# Altium footprint library CeleronLib_THD.PcbLib: 217 footprints (part 8 of 14)
Each footprint in its own frame and in the unit in brackets; x right, y up, seen from the top. Pads: shape width x height; smd on the part's side, far side on the other; paste and mask are expansions set on the pad; w line width, h text height; cw(c..) or ccw(c..) is an arc to the next point about the centre after c.
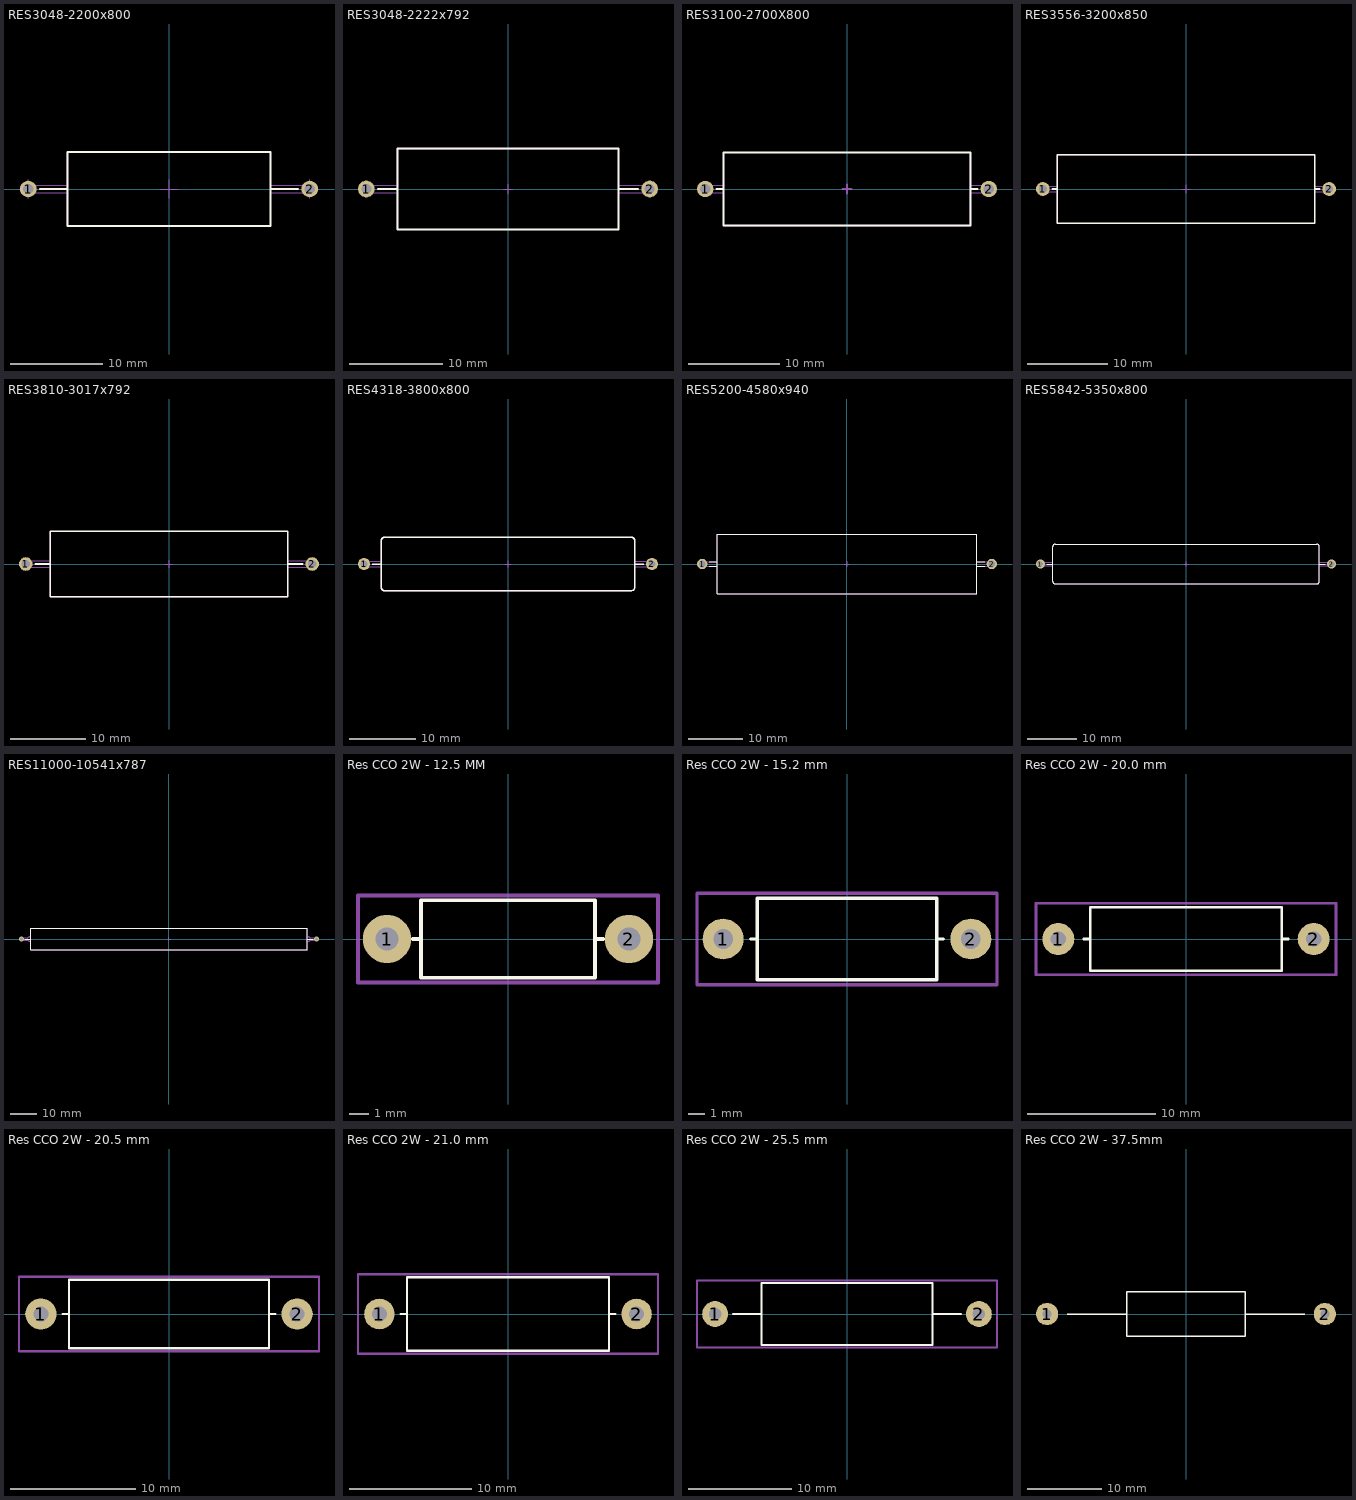
[diagram p7: the footprints below, top view; thin cyan lines are the x and y axes]

## RES3048-2200x800 [mm] "Resistor, Axial, Leads spacing 30.48mm, Lead Dia. 0.8, Body Lengh 22mm, Diameter 8mm"
height 8
pads (2):
  round 1.8 hole 1.1: 1(-15.24,0) 2(15.24,0)
Top Overlay:
  lines w0.2: -14,0 -11,0 ; 11,0 14,0 ; -11,-4 11,-4 11,4 -11,4 -11,-4
Mechanical 8:
  lines w0.1: -16.24,0 -15.24,0 ; -15.24,-1 -15.24,0 ; -15.24,1 -15.24,0 ; -14.24,0 -15.24,0 ; -1,0 0,0 ; 0,-1 0,0 ; 0,1 0,0 ; 1,0 0,0 ; 14.24,0 15.24,0 ; 15.24,-1 15.24,0 ; 15.24,1 15.24,0 ; 16.24,0 15.24,0
Top Assy:
  lines w0.1: -11,-0.4 -15.24,-0.4 cw(c-15.24,0) -15.24,0.4 -11,0.4 ; 11,-0.4 15.24,-0.4 ccw(c15.24,0) 15.24,0.4 11,0.4 ; -11,-4 -11,4 11,4 11,-4 -11,-4
3D body: height 8, standoff -3.8, extent -15.64,-4 15.64,4

## RES3048-2222x792 [mm] "Resistor, Axial, Pad spacing 30.48mm - Body Lengh 22.22mm X Body Diameter 7.92mm"
height 8.71
pads (2):
  round 1.8 hole 1.1: 1(-15.24,0) 2(15.24,0)
Top Overlay:
  lines w0.2: -14.011,0 -11.895,0 ; 11.895,0 14.011,0 ; -11.895,-4.355 -11.895,4.355 11.895,4.355 11.895,-4.355 -11.895,-4.355
Mechanical 8:
  lines w0.1: -15.74,0 -15.24,0 ; -15.24,-0.5 -15.24,0 ; -15.24,0.5 -15.24,0 ; -14.74,0 -15.24,0 ; -0.5,0 0,0 ; 0,-0.5 0,0 ; 0,0.5 0,0 ; 0.5,0 0,0 ; 14.74,0 15.24,0 ; 15.24,-0.5 15.24,0 ; 15.24,0.5 15.24,0 ; 15.74,0 15.24,0
Top Assy:
  lines w0.1: -11.895,-0.425 -15.24,-0.425 cw(c-15.24,0) -15.24,0.425 -11.895,0.425 ; 11.895,-0.425 15.24,-0.425 ccw(c15.24,0) 15.24,0.425 11.895,0.425 ; -11.895,-4.355 -11.895,4.355 11.895,4.355 11.895,-4.355 -11.895,-4.355
3D body: height 8.71, standoff -3.8, extent -15.665,-4.34 15.665,4.341

## RES3100-2700X800 [mm] "Resistor, Axial, Pad Spacing 31mm - Body Lengh 27mm X Body Diameter 8mm"
height 8
pads (2):
  round 1.8 hole 1.1: 1(-15.5,0) 2(15.5,0)
Top Overlay:
  lines w0.2: -14.275,0 -13.5,0 ; 13.5,0 14.275,0 ; -13.5,-4 13.5,-4 13.5,4 -13.5,4 -13.5,-4
Mechanical 8:
  lines w0.2: -16,0 -15.5,0 ; -15.5,-0.5 -15.5,0 ; -15.5,0.5 -15.5,0 ; -15,0 -15.5,0 ; -0.5,0 0,0 ; 0,-0.5 0,0 ; 0,0.5 0,0 ; 0.5,0 0,0 ; 15,0 15.5,0 ; 15.5,-0.5 15.5,0 ; 15.5,0.5 15.5,0 ; 16,0 15.5,0
Top Assy:
  lines w0.1: -13.5,-0.4 -15.5,-0.4 cw(c-15.5,0) -15.5,0.4 -13.5,0.4 ; 13.5,-0.4 15.5,-0.4 ccw(c15.5,0) 15.5,0.4 13.5,0.4 ; -13.5,-4 13.5,-4 13.5,4 -13.5,4 -13.5,-4
3D body: height 8, standoff -3.6, extent -15.9,-4 15.9,4

## RES3556-3200x850 [mm] "Resistor, Axial, Leads Spacing 35.56mm, Lead Dia. 0.7, Body Lengh 32mm, Diameter 8.5mm"
height 8.5
pads (2):
  round 1.7 hole 1: 1(-17.78,0) 2(17.78,0)
Top Overlay:
  lines w0.2: -16.58,0 -16,0 ; 16,0 16.58,0 ; -16,-4.25 16,-4.25 16,4.25 -16,4.25 -16,-4.25
Mechanical 8:
  lines w0.1: -18.28,0 -17.78,0 ; -17.78,-0.5 -17.78,0 ; -17.78,0.5 -17.78,0 ; -17.28,0 -17.78,0 ; -0.5,0 0,0 ; 0,-0.5 0,0 ; 0,0.5 0,0 ; 0.5,0 0,0 ; 17.28,0 17.78,0 ; 17.78,-0.5 17.78,0 ; 17.78,0.5 17.78,0 ; 18.28,0 17.78,0
Top Assy:
  lines w0.1: -16,-0.35 -17.78,-0.35 cw(c-17.78,0) -17.78,0.35 -16,0.35 ; 16,-0.35 17.78,-0.35 ccw(c17.78,0) 17.78,0.35 16,0.35 ; -16,-4.25 16,-4.25 16,4.25 -16,4.25 -16,-4.25
3D body: height 8.5, standoff -3.8, extent -18.13,-4.25 18.13,4.25

## RES3810-3017x792 [mm] "Resistor, Axial, Pad spacing 38.1mm - Body Lengh 30.17mm X Body Diameter 7.92mm"
height 8.71
pads (2):
  round 1.8 hole 1.1: 1(-19.05,0) 2(19.05,0)
Top Overlay:
  lines w0.2: -17.821,0 -15.765,0 ; 15.765,0 17.821,0 ; -15.765,-4.355 15.765,-4.355 15.765,4.355 -15.765,4.355 -15.765,-4.355
Mechanical 8:
  lines w0.1: -19.55,0 -19.05,0 ; -19.05,-0.5 -19.05,0 ; -19.05,0.5 -19.05,0 ; -18.55,0 -19.05,0 ; -0.5,0 0,0 ; 0,-0.5 0,0 ; 0,0.5 0,0 ; 0.5,0 0,0 ; 18.55,0 19.05,0 ; 19.05,-0.5 19.05,0 ; 19.05,0.5 19.05,0 ; 19.55,0 19.05,0
Top Assy:
  lines w0.1: -15.765,-0.425 -19.05,-0.425 cw(c-19.05,0) -19.05,0.425 -15.765,0.425 ; 15.765,-0.425 19.05,-0.425 ccw(c19.05,0) 19.05,0.425 15.765,0.425 ; -15.765,-4.355 15.765,-4.355 15.765,4.355 -15.765,4.355 -15.765,-4.355
3D body: height 8.71, standoff -3.8, extent -19.475,-4.34 19.475,4.341

## RES4318-3800x800 [mm] "Resistor, Axial, Pad spacing 43.18mm - Body Lengh 38mm X Body Diameter 8mm"
height 8
pads (2):
  round 1.8 hole 1.1: 1(-21.59,0) 2(21.59,0)
Top Overlay:
  lines w0.2: -20.353,0 -19,0 ; 19,0 20.353,0 ; -19,-3.5 ccw(c-18.5,-3.5) -18.5,-4 18.5,-4 ccw(c18.5,-3.5) 19,-3.5 19,3.5 ccw(c18.5,3.5) 18.5,4 -18.5,4 ccw(c-18.5,3.5) -19,3.5 -19,-3.5
Mechanical 8:
  lines w0.1: -21.59,0 -21.59,0.5 -21.59,0 ; -21.59,0 -21.09,0 -21.59,0 ; -21.59,0 -21.59,-0.5 -21.59,0 ; -21.59,0 -22.09,0 -21.59,0 ; 0,0 0,0.5 0,0 ; 0,0 0.5,0 0,0 ; 0,0 0,-0.5 0,0 ; 0,0 -0.5,0 0,0 ; 21.59,0 21.59,0.5 21.59,0 ; 21.59,0 22.09,0 21.59,0 ; 21.59,0 21.59,-0.5 21.59,0 ; 21.59,0 21.09,0 21.59,0
Top Assy:
  lines w0.1: -19,-0.4 -21.59,-0.4 cw(c-21.59,0) -21.59,0.4 -19,0.4 ; 19,-0.4 21.59,-0.4 ccw(c21.59,0) 21.59,0.4 19,0.4 ; -19,-3.5 ccw(c-18.5,-3.5) -18.5,-4 18.5,-4 ccw(c18.5,-3.5) 19,-3.5 19,3.5 ccw(c18.5,3.5) 18.5,4 -18.5,4 ccw(c-18.5,3.5) -19,3.5 -19,-3.5
3D body: height 8, standoff -3.6, extent -21.99,-4 21.99,4

## RES5200-4580x940 [mm] "Resistor, Axial, Leads Spacing 52mm, Lead Dia. 0.8, Body Lengh 45.8mm, Diameter 9.4mm"
height 10.9
pads (2):
  round 1.9 hole 1.2: 1(-26.67,0) 2(26.67,0)
Top Overlay:
  lines w0.2: -25.397,-0.45 -23.9,-0.45 ; -25.397,0.45 -23.9,0.45 ; 23.9,-0.45 25.397,-0.45 ; 23.9,0.45 25.397,0.45 ; -23.9,-5.45 23.9,-5.45 23.9,5.45 -23.9,5.45 -23.9,-5.45
Mechanical 8:
  lines w0.1: -27.17,0 -26.67,0 ; -26.67,-0.5 -26.67,0 ; -26.67,0.5 -26.67,0 ; -26.17,0 -26.67,0 ; -0.5,0 0,0 ; 0,-0.5 0,0 ; 0,0.5 0,0 ; 0.5,0 0,0 ; 26.17,0 26.67,0 ; 26.67,-0.5 26.67,0 ; 26.67,0.5 26.67,0 ; 27.17,0 26.67,0
Top Assy:
  lines w0.1: -23.9,-0.45 -26.67,-0.45 cw(c-26.67,0) -26.67,0.45 -23.9,0.45 ; 23.9,-0.45 26.67,-0.45 ccw(c26.67,0) 26.67,0.45 23.9,0.45 ; -23.9,-5.45 23.9,-5.45 23.9,5.45 -23.9,5.45 -23.9,-5.45
3D body: height 10.9, standoff -3.6, extent -27.12,-5.45 27.12,5.45

## RES5842-5350x800 [mm] "Resistor, Axial, Pad spacing 58.42mm - Body Lengh 53.5mm X Body Diameter 8mm"
height 8
pads (2):
  round 1.8 hole 1.1: 1(-29.21,0) 2(29.21,0)
Top Overlay:
  lines w0.2: -27.973,0 -26.75,0 ; 26.75,0 27.973,0 ; -26.75,-3.5 ccw(c-26.25,-3.5) -26.25,-4 26.25,-4 ccw(c26.25,-3.5) 26.75,-3.5 26.75,3.5 ccw(c26.25,3.5) 26.25,4 -26.25,4 ccw(c-26.25,3.5) -26.75,3.5 -26.75,-3.5
Mechanical 8:
  lines w0.1: -29.21,0 -29.71,0 -29.21,0 ; -29.21,0 -29.21,-0.5 -29.21,0 ; -29.21,0 -28.71,0 -29.21,0 ; -29.21,0 -29.21,0.5 -29.21,0 ; 0,0 -0.5,0 0,0 ; 0,0 0,-0.5 0,0 ; 0,0 0.5,0 0,0 ; 0,0 0,0.5 0,0 ; 29.21,0 28.71,0 29.21,0 ; 29.21,0 29.21,-0.5 29.21,0 ; 29.21,0 29.71,0 29.21,0 ; 29.21,0 29.21,0.5 29.21,0
Top Assy:
  lines w0.1: -26.75,-0.4 -29.21,-0.4 cw(c-29.21,0) -29.21,0.4 -26.75,0.4 ; 26.75,-0.4 29.21,-0.4 ccw(c29.21,0) 29.21,0.4 26.75,0.4 ; -26.75,-3.5 ccw(c-26.25,-3.5) -26.25,-4 26.25,-4 ccw(c26.25,-3.5) 26.75,-3.5 26.75,3.5 ccw(c26.25,3.5) 26.25,4 -26.25,4 ccw(c-26.25,3.5) -26.75,3.5 -26.75,-3.5
3D body: height 8, standoff -3.6, extent -29.61,-4 29.61,4

## RES11000-10541x787 [mm] "Resistor, Axial, Pad spacing 110mm - Body Lengh 105.41mm X Body Diameter 7.87mm"
height 7.87
pads (2):
  round 1.8 hole 1.1: 1(-55,0) 2(55,0)
Top Overlay:
  lines w0.2: -53.7,0 -51.435,0 ; 51.435,0 53.7,0 ; -51.435,-3.935 -51.435,3.935 51.435,3.935 51.435,-3.935 -51.435,-3.935
Mechanical 8:
  lines w0.1: -55.5,0 -55,0 ; -55,-0.5 -55,0 ; -55,0.5 -55,0 ; -54.5,0 -55,0 ; 54.5,0 55,0 ; 55,-0.5 55,0 ; 55,0.5 55,0 ; 55.5,0 55,0 ; 0,0 -0.5,0 0,0 ; 0,0 0,0.5 0,0 ; 0,0 0,-0.5 0,0 ; 0,0 0.5,0 0,0
Top Assy:
  lines w0.1: -52.599,-0.4 -52.599,0.4 ; -51.435,-0.799 -51.905,-0.799 cw(c-51.905,0.001) -52.597,-0.4 -55,-0.4 cw(c-55,0) -55,0.4 -52.599,0.4 ; -51.435,0.801 -51.905,0.801 ccw(c-51.905,0.001) -52.599,0.4 ; 51.435,-0.799 51.905,-0.799 ccw(c51.905,0.001) 52.597,-0.4 55,-0.4 ccw(c55,0) 55,0.4 52.599,0.4 ; 51.435,0.801 51.905,0.801 cw(c51.905,0.001) 52.599,0.4 ; 52.599,-0.4 52.599,0.4 ; -51.435,-3.935 51.435,-3.935 51.435,3.935 -51.435,3.935 -51.435,-3.935
3D body: height 7.87, standoff -3.6, extent -55.4,-3.935 55.4,3.935

## Res CCO 2W - 12.5 MM [mm] "Резистор СCO, выводной 6mm, L=15.2mm, l=25mm, d=0.8mm"
height 6
pads (2):
  round 2.5 hole 1.2: 1(-6.25,0) 2(6.25,0)
Top Overlay:
  lines w0.2: -4.9,0 -4.5,0 ; 4.5,0 4.9,0 ; -4.5,-2 -4.5,2 4.5,2 4.5,-2 -4.5,-2
Top Courtyard:
  lines w0.2: -7.75,-2.25 7.75,-2.25 7.75,2.25 -7.75,2.25 -7.75,-2.25
3D body: height 3.4, standoff -1.2, extent -6.781,-1.4 6.681,1.457

## Res CCO 2W - 15.2 mm [mm] "Резистор СCO, выводной 6mm, L=15.2mm, l=25mm, d=0.8mm"
height 6
pads (2):
  round 2.5 hole 1.2: 1(-7.6,0) 2(7.6,0)
Top Overlay:
  lines w0.2: -5.9,0 -5.5,0 ; 5.5,0 5.9,0 ; -5.5,-2.5 5.5,-2.5 5.5,2.5 -5.5,2.5 -5.5,-2.5
Top Courtyard:
  lines w0.2: -9.2,-2.8 -9.2,2.8 9.2,2.8 9.2,-2.8 -9.2,-2.8
3D body: height 5, standoff -3, extent -8.02,-2 8.02,2

## Res CCO 2W - 20.0 mm [mm] "Резистор СCO, выводной 6mm, L=15.2mm, l=25mm, d=0.8mm"
height 6
pads (2):
  round 2.5 hole 1.2: 1(-10,0) 2(10,0)
Top Overlay:
  lines w0.2: -8,0 -7.6,0 ; 7.6,0 8,0 ; -7.5,-2.5 7.5,-2.5 7.5,2.5 -7.5,2.5 -7.5,-2.5
Top Courtyard:
  lines w0.2: -11.75,-2.8 -11.75,2.8 11.75,2.8 11.75,-2.8 -11.75,-2.8
3D body: height 5.2, standoff -2, extent -10.4,-2.5 10.4,2.5

## Res CCO 2W - 20.5 mm [mm] "Резистор СCO, выводной 6mm, L=15.2mm, l=25mm, d=0.8mm"
height 6
pads (2):
  round 2.5 hole 1.2: 1(-10.25,0) 2(10.25,0)
Top Overlay:
  lines w0.2: -8.5,0 -8.1,0 ; 8.1,0 8.5,0 ; -8,-2.75 8,-2.75 8,2.75 -8,2.75 -8,-2.75
Top Courtyard:
  lines w0.2: -12,-3 -12,3 12,3 12,-3 -12,-3
3D body: height 5.5, standoff -3, extent -10.51,-2.75 10.51,2.75

## Res CCO 2W - 21.0 mm [mm] "Резистор СCO, выводной 6mm, L=15.2mm, l=25mm, d=0.8mm"
height 6
pads (2):
  round 2.5 hole 1.2: 1(-10.5,0) 2(10.5,0)
Top Overlay:
  lines w0.2: -8.75,0 -8.25,0 ; 8.35,0 8.75,0 ; -8.25,-3 8.25,-3 8.25,3 -8.25,3 -8.25,-3
Top Courtyard:
  lines w0.2: -12.25,-3.25 -12.25,3.25 12.25,3.25 12.25,-3.25 -12.25,-3.25
3D body: height 7.1, standoff -2.93, extent -10.91,-3 10.91,2.992

## Res CCO 2W - 25.5 mm [mm] "Резистор СCO, выводной 6mm, L=15.2mm, l=25mm, d=0.8mm"
height 6
pads (2):
  round 2.5 hole 1.2: 1(-12.75,0) 2(12.75,0)
Top Overlay:
  lines w0.2: -11,0 -8.25,0 ; 8.35,0 11,0 ; -8.25,-3 8.25,-3 8.25,3 -8.25,3 -8.25,-3
Top Courtyard:
  lines w0.2: -14.5,-3.25 -14.5,3.25 14.5,3.25 14.5,-3.25 -14.5,-3.25
3D body: height 6.5, standoff -3, extent -13.1,-2.479 13.1,2.512

## Res CCO 2W - 37.5mm [mm] "Резистор СCO, выводной 6mm, L=16.0mm, l=25mm, d=0.8mm"
height 6
pads (2):
  round 3 hole 1.2: 1(-18.75,0) 2(18.75,0)
Top Overlay:
  lines w0.2: -16,0 -8,0 ; 8,0 16,0 ; -8,-3 8,-3 8,3 -8,3 -8,-3